# Altium footprint library AHMET_CAN_KARACAN.PcbL.PcbLib: 65 footprints (part 5 of 5)
Each footprint in its own frame and in the unit in brackets; x right, y up, seen from the top. Pads: shape width x height; smd on the part's side, far side on the other; paste and mask are expansions set on the pad; w line width, h text height; cw(c..) or ccw(c..) is an arc to the next point about the centre after c.
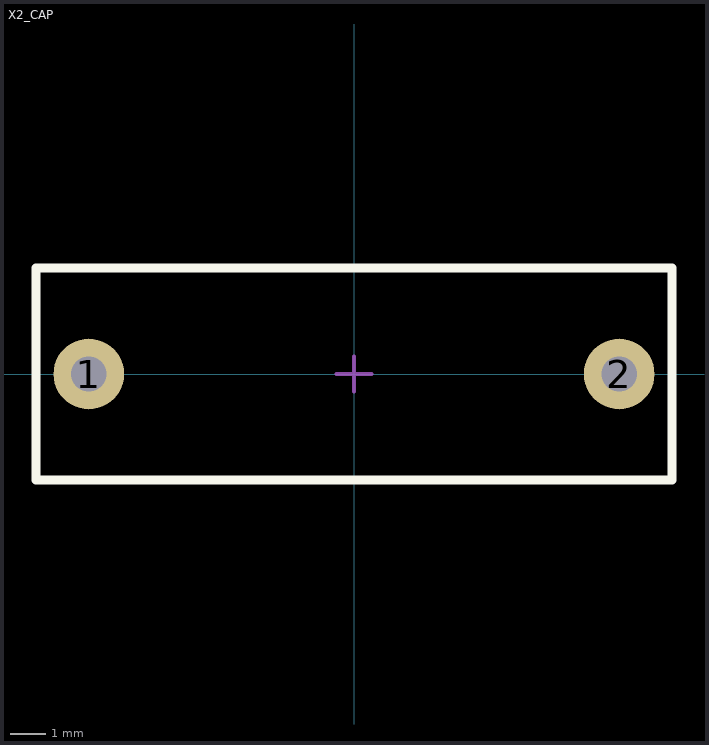
[diagram p4: the footprint, top view; thin cyan lines are the x and y axes]

## X2_CAP [mm]
pads (2):
  round 2 hole 1: 1(-7.5,0) 2(7.5,0)
Top Overlay:
  lines w0.254: -9,-3 -9,3 9,3 9,-3 -9,-3
Top Component Center:
  lines w0.1: -0.5,0 0.5,0 ; 0,-0.5 0,0.5 ; -9,-3 -9,3 9,3 9,-3 -9,-3
Top Designator:
  lines w0.1: -9,-3 -9,3 9,3 9,-3 -9,-3
  text ".Designator" at -0.4,-0.233 h0.5
3D body "CFR F15 L18 B6 H12.stp": height 12, standoff -3, extent -9,-3 9,3